# Altium footprint library swatpcblib.PcbLib: 202 footprints (part 6 of 13)
Each footprint in its own frame and in the unit in brackets; x right, y up, seen from the top. Pads: shape width x height; smd on the part's side, far side on the other; paste and mask are expansions set on the pad; w line width, h text height; cw(c..) or ccw(c..) is an arc to the next point about the centre after c.
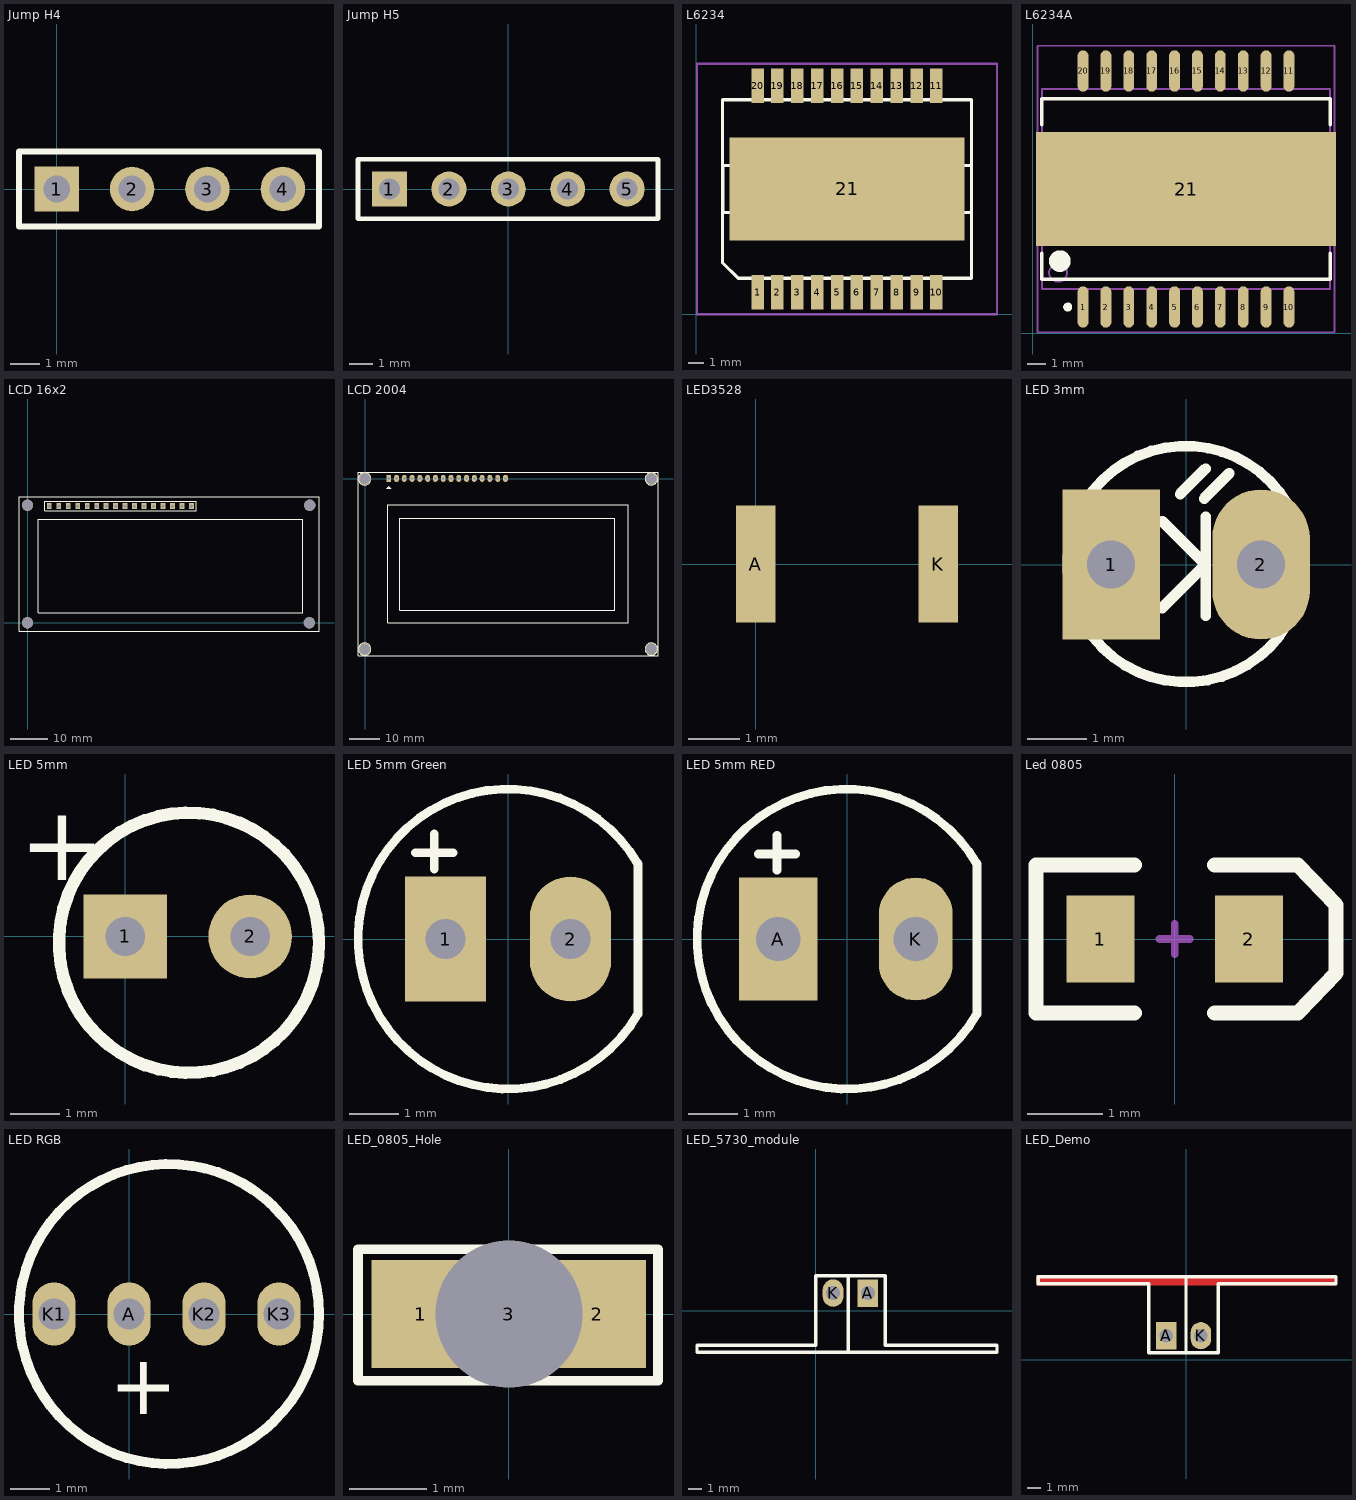
[diagram p5: the footprints below, top view; thin cyan lines are the x and y axes]

## Jump H4 [mm]
pads (4):
  rect 1.5x1.5 hole 0.9: 1(0,0)
  round 1.5 hole 0.9: 2(2.54,0) 3(5.08,0) 4(7.62,0)
Top Overlay:
  lines w0.2: -1.27,-1.27 -1.27,1.27 8.839,1.27 8.839,-1.27 -1.27,-1.27
3D body "HDR4.step": height 4.33, standoff -3, extent -1.295,-7 8.865,1.27

## Jump H5 [mm]
pads (5):
  rect 1.5x1.5 hole 0.9: 1(-5.08,0)
  round 1.5 hole 0.9: 2(-2.54,0) 3(0,0) 4(2.54,0) 5(5.08,0)
Top Overlay:
  lines w0.2: -6.426,-1.27 -6.426,1.27 6.401,1.27 6.401,-1.27 -6.426,-1.27
3D body "HDR5.step": height 4.33, standoff -3, extent -6.35,-1.27 6.35,7

## L6234 [mm]
pads (21):
  rect 0.8x2.2 smd: 1(3.937,1.401) 2(5.207,1.401) 3(6.477,1.401) 4(7.747,1.401) 5(9.017,1.401) 6(10.287,1.401) 7(11.557,1.401) 8(12.827,1.401) 9(14.097,1.401) 10(15.367,1.401) 11(15.367,14.601) 12(14.097,14.601) 13(12.827,14.601) 14(11.557,14.601) 15(10.287,14.601) 16(9.017,14.601) 17(7.747,14.601) 18(6.477,14.601) 19(5.207,14.601) 20(3.937,14.601)
  rect 15x6.6 smd: 21(9.652,8.001)
Top Overlay:
  lines w0.203: 1.689,3.302 1.692,6.501 1.712,6.501 ; 1.69,3.301 2.69,2.301 ; 1.712,9.501 1.712,6.501 ; 2.689,2.301 17.612,2.301 17.612,6.501 16.652,6.501 16.652,9.501 17.612,9.501 17.612,13.701 1.692,13.701 1.692,9.501 2.652,9.501 2.652,6.501 1.712,6.501 ; 17.617,6.501 17.617,9.501
Mechanical 12:
  lines w0.152: 0.064,0 0.064,16.002 19.241,16.002 19.241,0 0.064,0

## L6234A [mm]
pads (21):
  oval 0.6x2.3 smd: 1(2.794,1.451) 2(4.064,1.451) 3(5.334,1.451) 4(6.604,1.451) 5(7.874,1.451) 6(9.144,1.451) 7(10.414,1.451) 8(11.684,1.451) 9(12.954,1.451) 10(14.224,1.451) 11(14.224,14.551) 12(12.954,14.551) 13(11.684,14.551) 14(10.414,14.551) 15(9.144,14.551) 16(7.874,14.551) 17(6.604,14.551) 18(5.334,14.551) 19(4.064,14.551) 20(2.794,14.551)
  rect 16.65x6.35 smd: 21(8.509,8.001)
Top Overlay:
  circle w0.25: c1.944,1.451 r0.125
  circle w0.6: c1.509,4.001 r0.3
  lines w0.2: 0.509,4.426 0.509,3.001 16.509,3.001 16.509,4.426 ; 0.509,11.576 0.509,13.001 16.509,13.001 16.509,11.576
Mechanical 13:
  circle w0.1: c1.409,3.351 r0.5
  lines w0.1: 0.509,2.451 16.509,2.451 16.509,13.551 0.509,13.551 0.509,2.451
Mechanical 15:
  lines w0.1: 8.009,8.001 9.009,8.001 ; 8.509,7.501 8.509,8.501 ; 0.259,0.051 16.759,0.051 16.759,15.951 0.259,15.951 0.259,0.051
3D body: height 3.6, standoff 0, extent 0.509,2.451 16.509,13.551

## LCD 16x2 [mm]
pads (20):
  rect 1.3x1.6 hole 0.9: 1(5.842,31.242) 2(8.382,31.242) 3(10.922,31.242) 4(13.462,31.242) 5(16.002,31.242) 6(18.542,31.242) 7(21.082,31.242) 8(23.622,31.242) 9(26.162,31.242) 10(28.702,31.242) 11(31.242,31.242) 12(33.782,31.242) 13(36.322,31.242) 14(38.862,31.242) 15(41.402,31.242) 16(43.942,31.242)
  round 3 hole 3: ""(0,0) ""(75.565,0)
  round 3 hole 3 paste+0 mask+0: ""(0,31.496) ""(75.667,31.496)
Top Overlay:
  lines w0.2: 4.572,29.972 45.212,29.972 45.212,32.512 6.477,32.512 4.572,32.512 4.572,29.972
  lines w0.254: -2.286,-2.286 -2.286,33.782 78.156,33.782 78.156,-2.286 -2.286,-2.286 ; 2.841,2.714 2.841,27.714 73.841,27.714 73.841,2.714 2.841,2.714
3D body "User Library-LCD 16x2 WC1602A0-SFYLNC06.step": height 20.4, standoff 7.5, extent -2.17,-2.243 78.08,33.757

## LCD 2004 [mil]
pads (20):
  rect 62x90 hole 39: 1(305,5)
  oval 62x90 hole 39: 2(405,5) 3(505,5) 4(605,5) 5(705,5) 6(805,5) 7(905,5) 8(1005,5) 9(1105,5) 10(1205,5) 11(1305,5) 12(1405,5) 13(1505,5) 14(1605,5) 15(1705,5) 16(1805,5)
  round 157.48 hole 137.8: "Hole 0"(-5,-2190) "Hole 0"(-4,0) "Hole 0"(3678,-2188) "Hole 0"(3680,0)
Top Overlay:
  circle w7: c-4,-2189 r79.06
  circle w7: c-5,-1 r79.06
  circle w7: c3679,-1 r79.06
  circle w7: c3679,-2189 r79.06
  region: 305,-95 270,-130 340,-130
  lines w7: -90,-2275 3765,-2275 3765,85 -90,85 -90,-2275 ; 294,-1847 3381,-1847 3381,-332 294,-332 294,-1847 ; 444,-1690 3210,-1690 3210,-507 444,-507 444,-1690
3D body "LCD2004.x_b": height 435.04, standoff -39.37, extent -92.15,-2276.56 3766.12,85.65

## LED3528 [mil]
pads (2):
  rect 30x90 smd: A(0,0) K(140,0)
3D body "LED3528.X_B": height 74.8, standoff 0, extent 1.11,-55.12 138.9,55.12

## LED 3mm [mil]
height 100
pads (2):
  rect 65x100 hole 32: 1(-50,0)
  oval 65x100 hole 32: 2(50,0)
Top Overlay:
  lines w7: -16,-29 13,0 -16,29 ; -4,47 13,64 ; 12,44 29,61 ; 13,-34 13,32 ; 67.92,-39.35 67.92,39.84
  lines w7.01: 67.57,-39.74 cw(c-0.2,0.35) 67.72,40.19
3D body "SW3DPS-LED DIP 3MM-DEFAULT.STEP": height 255.91, standoff -78.74, extent -78.9,-74.61 58.9,75

## LED 5mm [mm]
pads (2):
  rect 1.7x1.7 hole 0.8: 1(0,0)
  round 1.7 hole 0.8: 2(2.54,0)
Top Overlay:
  circle w0.254: c1.295,-0.127 r2.644
  text "+" at -2.159,1.143 h1.52

## LED 5mm Green [mil]
height 150
pads (2):
  rect 65x100 hole 32: 1(-50,0)
  oval 65x100 hole 32: 2(50,0)
Top Overlay:
  lines w7: -74,69 -44,69 ; -59,56 -59,84 ; 103.51,60.71 ccw(c0,0) 103.94,-59.97 ; 104,-59 104,60
3D body "SW3dPS-LED green.STEP": height 386.85, standoff -67.48, extent -104.33,-103.66 104.33,105

## LED 5mm RED [mm]
height 3.81
pads (2):
  rect 1.6x2.5 hole 0.9: A(-1.397,0)
  oval 1.5x2.5 hole 0.9: K(1.397,0)
Top Overlay:
  lines w0.178: -1.803,1.727 -1.041,1.727 ; -1.422,1.397 -1.422,2.108 ; 2.629,1.542 ccw(c0,0) 2.64,-1.523 ; 2.642,-1.499 2.642,1.524
3D body "SW3dPS-LEDd5R.STEP": height 12.31, standoff -2.49, extent -2.939,-2.972 2.481,3.048

## Led 0805 [mm]
height 1.1
pads (2):
  rect 0.9x1.15 smd: 1(-0.98,0) 2(0.98,0)
Top Overlay:
  lines w0.2: -0.53,-0.975 -1.83,-0.975 -1.83,0.975 -0.53,0.975 ; 0.53,-0.975 1.63,-0.975 2.13,-0.45 2.13,0.45 1.63,0.975 0.53,0.975
Mechanical 1:
  lines w0.1: -0.2,0 0.2,0 ; 0,-0.2 0,0.2

## LED RGB [mm]
pads (4):
  oval 1.1x1.6 hole 0.8: A(0,0) K1(-1.905,0) K2(1.905,0) K3(3.81,0)
Top Overlay:
  circle w0.254: c1.016,0 r3.81
  text "+" at -0.508,-2.54 h1.52

## LED_0805_Hole [mil]
pads (3):
  rect 50x55 smd: 1(-45,0) 2(45,0)
  round 70.87 hole 74.8: 3(0,0)
Top Overlay:
  lines w4: -17,-25 17,-25 ; -17,25 17,25
  lines w5: -77,-34 -77,33 76,33 76,-34 -77,-34
3D body "SW3dPS-smt_resistor_packages.STEP": height 24.02, standoff -0.39, extent -39.76,-27 39.77,23

## LED_5730_module [mm]
pads (2):
  rect 1.5x2 hole 1: A(3.81,1.27)
  oval 1.5x2 hole 1: K(1.27,1.27)
Top Overlay:
  lines w0.254: 2.362,-3.023 2.362,2.54 ; -8.636,-3.048 -8.636,-2.54 0,-2.54 0,2.54 5.08,2.54 5.08,0 5.08,-2.54 13.208,-2.54 13.208,-3.048 -8.636,-3.048
3D body "LED_5730.step": height 24.92, standoff -5.72, extent -8.638,-5.75 13.362,1.575

## LED_Demo [mm]
pads (2):
  rect 1.5x2 hole 1: A(-1.448,1.778)
  oval 1.5x2 hole 1: K(1.092,1.778)
Top Layer:
  pour cut-out: -10.998,6.223 10.998,6.223 10.998,5.461 -10.998,5.461
Top Overlay:
  lines w0.254: 0,0.508 0,6.071 ; -10.846,5.588 -2.718,5.588 -2.718,3.048 -2.718,0.508 2.362,0.508 2.362,5.588 10.998,5.588 10.998,6.096 -10.846,6.096 -10.846,5.588
3D body "LED_5730.step": height 24.92, standoff -5.72, extent -11,1.473 11,8.798